# Altium schematic symbol library FPGA_Xilinx_Virtex5.SchLib: 41 symbols (part 26 of 27) (continued)
## XC5VTX150T-FF1759 (continued)
part V pins: AA21 VREFN_0 (io), AA22 VP_0 (io), AB21 VN_0 (io), AB22 VREFP_0 (io), AC21 DXN_0 (io), AC22 DXP_0 (io), AF15 TMS_0 (io), AF16 TCK_0 (io), AG16 TDI_0 (io), AG29 D_OUT_BUSY_0 (io), AH16 TDO_0 (io), AH28 M2_0 (io), AJ16 CCLK_0 (io), AJ27 M1_0 (io), AJ28 M0_0 (io), P13 VCCO_0 (power), P15 RDWR_B_0 (io), R14 DONE_0 (io), R15 D_IN_0 (io), R16 VCCO_0 (power), R29 PROGRAM_B_0 (io), T14 INIT_B_0 (io), T29 HSWAPEN_0 (io), T30 CS_B_0 (io)
part W pins: A6 GND (power), A7 GND (power), A12 GND (power), A13 GND (power), A18 GND (power), A19 GND (power), A23 GND (power), A24 GND (power), A25 GND (power), A30 GND (power), A31 GND (power), A36 GND (power), A37 GND (power), AA12 VCCAUX (power), AA14 VCCINT (power), AA16 VCCINT (power), AA18 VCCINT (power), AA20 VCCINT (power), AA24 VCCINT (power), AA26 VCCINT (power), AA28 VCCAUX (power), AB13 VCCINT (power), AB15 VCCINT (power), AB17 VCCINT (power), AB19 VCCINT (power), AB23 VCCINT (power), AB25 VCCINT (power), AB27 VCCINT (power), AB29 VCCAUX (power), AC12 VCCAUX (power), AC14 VCCINT (power), AC16 VCCINT (power), AC18 VCCINT (power), AC20 VCCINT (power), AC24 VCCINT (power), AC26 VCCINT (power), AC28 VCCINT (power), AD13 VCCAUX (power), AD15 VCCINT (power), AD17 VCCINT (power), AD19 VCCINT (power), AD21 VCCINT (power), AD23 VCCINT (power), AD25 VCCINT (power), AD27 VCCINT (power), AD29 VCCAUX (power), AE12 VCCAUX (power), AE14 VCCINT (power), AE16 VCCINT (power), AE18 VCCINT (power), AE20 VCCINT (power), AE22 VCCINT (power), AE24 VCCINT (power), AE26 VCCINT (power), AE28 VCCINT (power), AE30 VCCAUX (power), AF13 VCCAUX (power), AF17 VCCINT (power), AF19 VCCINT (power), AF21 VCCINT (power), AF23 VCCINT (power), AF25 VCCINT (power), AF27 VCCINT (power), AG18 VCCINT (power), AG20 VCCINT (power), AG22 VCCINT (power), AG24 VCCINT (power), AG26 VCCINT (power), AG28 VCCAUX (power), AG30 VCCAUX (power), AH19 VCCINT (power), AH21 VCCINT (power), AH23 VCCINT (power), AH25 VCCINT (power), AH27 VCCINT (power), AJ20 VCCINT (power), AJ22 VCCINT (power), AJ26 VCCINT (power), B3 GND (power), B4 GND (power), B9 GND (power), B10 GND (power), B15 GND (power), B16 GND (power), B19 GND (power), B20 GND (power), B24 GND (power), B27 GND (power), B28 GND (power), B33 GND (power), B34 GND (power), B39 GND (power), B40 GND (power), C6 GND (power), C12 GND (power), C18 GND (power), C19 GND (power), C24 GND (power), C25 GND (power), C31 GND (power), C37 GND (power), D1 GND (power), D3 GND (power), D5 GND (power), D6 GND (power), D7 GND (power), D8 GND (power), D9 GND (power), D11 GND (power), D12 GND (power), D13 GND (power), D14 GND (power), D15 GND (power), D17 GND (power), D18 GND (power), D19 GND (power), D24 GND (power), D25 GND (power), D26 GND (power), D28 GND (power), D29 GND (power), D30 GND (power), D31 GND (power), D32 GND (power), D34 GND (power), D35 GND (power), D36 GND (power), D37 GND (power), D38 GND (power), D40 GND (power), D42 GND (power), E4 GND (power), E5 GND (power), E6 GND (power), E9 GND (power), E10 GND (power), E11 GND (power), E15 GND (power), E16 GND (power), E17 GND (power), E21 GND (power), E26 GND (power), E27 GND (power), E28 GND (power), E31 GND (power), E32 GND (power), E33 GND (power), E34 GND (power), E38 GND (power), E39 GND (power), F2 GND (power), F5 GND (power), F8 GND (power), F18 GND (power), F28 GND (power), F33 GND (power), F38 GND (power), F41 GND (power), G2 GND (power), G4 GND (power), G5 GND (power), G15 GND (power), G25 GND (power), G35 GND (power), G38 GND (power), N20 VCCINT (power), P23 VCCINT (power), R18 VCCINT (power), R20 VCCINT (power), R22 VCCINT (power), R24 VCCINT (power), R28 VBATT_0 (power), T13 VCCAUX (power), T15 VCCINT (power), T17 VCCINT (power), T19 VCCINT (power), T21 VCCINT (power), T23 VCCINT (power), T25 VCCINT (power), T27 VCCINT (power), U14 VCCINT (power), U16 VCCINT (power), U18 VCCINT (power), U20 VCCINT (power), U22 VCCINT (power), U24 VCCINT (power), U26 VCCINT (power), U28 VCCAUX (power), V13 VCCAUX (power), V15 VCCINT (power), V17 VCCINT (power), V19 VCCINT (power), V21 VCCINT (power), V23 VCCINT (power), V25 VCCINT (power), V27 VCCINT (power), V29 VCCAUX (power), W12 VCCAUX (power), W14 VCCINT (power), W16 VCCINT (power), W18 VCCINT (power), W20 VCCINT (power), W22 VCCINT (power), W24 VCCINT (power), W26 VCCINT (power), W28 VCCAUX (power), Y13 VCCAUX (power), Y15 VCCINT (power), Y17 VCCINT (power), Y19 VCCINT (power), Y21 AVSS_0 (power), Y22 AVDD_0 (power), Y23 VCCINT (power), Y25 VCCINT (power), Y27 VCCINT (power)
part X pins: AA1 GND (power), AA5 GND (power), AA13 GND (power), AA15 GND (power), AA17 GND (power), AA19 GND (power), AA23 GND (power), AA25 GND (power), AA27 GND (power), AA29 GND (power), AA33 GND (power), AA38 GND (power), AA42 GND (power), AB1 GND (power), AB3 GND (power), AB5 GND (power), AB10 GND (power), AB12 GND (power), AB14 GND (power), AB16 GND (power), AB18 GND (power), AB20 GND (power), AB24 GND (power), AB26 GND (power), AB28 GND (power), AB30 GND (power), AB38 GND (power), AB40 GND (power), AB42 GND (power), AC4 GND (power), AC5 GND (power), AC7 GND (power), AC13 GND (power), AC15 GND (power), AC17 GND (power), AC19 GND (power), AC23 GND (power), AC25 GND (power), AC27 GND (power), AC29 GND (power), AC37 GND (power), AC38 GND (power), AC39 GND (power), AD2 GND (power), AD5 GND (power), AD12 GND (power), AD14 GND (power), AD16 GND (power), AD18 GND (power), AD20 GND (power), AD22 GND (power), AD24 GND (power), AD26 GND (power), AD28 GND (power), AD34 GND (power), AD38 GND (power), AD41 GND (power), AE2 GND (power), AE4 GND (power), AE5 GND (power), AE6 GND (power), AE11 GND (power), AE13 GND (power), AE15 GND (power), AE17 GND (power), AE19 GND (power), AE21 GND (power), AE23 GND (power), AE25 GND (power), AE27 GND (power), AE29 GND (power), AE31 GND (power), AE38 GND (power), AE39 GND (power), AE41 GND (power), AF4 GND (power), AF8 GND (power), AF18 GND (power), AF20 GND (power), AF22 GND (power), AF24 GND (power), AF26 GND (power), AF28 GND (power), AF30 GND (power), AF38 GND (power), AF39 GND (power), AG1 GND (power), AG4 GND (power), AG5 GND (power), AG15 GND (power), AG17 GND (power), AG19 GND (power), AG21 GND (power), AG23 GND (power), AG25 GND (power), AG27 GND (power), AG35 GND (power), AG39 GND (power), AG42 GND (power), AH1 GND (power), AH3 GND (power), AH4 GND (power), AH12 GND (power), AH18 GND (power), AH20 GND (power), AH22 GND (power), AH24 GND (power), AH26 GND (power), AH32 GND (power), AH39 GND (power), AH40 GND (power), AH42 GND (power), AJ4 GND (power), AJ5 GND (power), AJ9 GND (power), AJ19 GND (power), AJ21 GND (power), AJ23 GND (power), AJ29 GND (power), AJ38 GND (power), AJ39 GND (power), AK2 GND (power), AK5 GND (power), AK6 GND (power), AK16 GND (power), AK26 GND (power), AK36 GND (power), AK38 GND (power), AK41 GND (power), AL2 GND (power), AL4 GND (power), AL5 GND (power), AL13 GND (power), AL23 GND (power), AL33 GND (power), AL38 GND (power), AL39 GND (power), AL41 GND (power), AM4 GND (power), AM10 GND (power), AM20 GND (power), AM30 GND (power), AM39 GND (power), AN1 GND (power), AN4 GND (power), AN7 GND (power), AN17 GND (power), AN27 GND (power), AN37 GND (power), AN39 GND (power), AN42 GND (power), AP1 GND (power), AP3 GND (power), AP4 GND (power), AP14 GND (power), AP24 GND (power), AP34 GND (power), AP39 GND (power), AP40 GND (power), AP42 GND (power), G39 GND (power), G41 GND (power), H4 GND (power), H12 GND (power), H22 GND (power), H32 GND (power), H39 GND (power), J1 GND (power), J4 GND (power), J9 GND (power), J19 GND (power), J29 GND (power), J39 GND (power), J42 GND (power), K1 GND (power), K3 GND (power), K4 GND (power), K6 GND (power), K16 GND (power), K26 GND (power), K36 GND (power), K39 GND (power), K40 GND (power), K42 GND (power), L4 GND (power), L5 GND (power), L13 GND (power), L23 GND (power), L33 GND (power), L38 GND (power), L39 GND (power), M2 GND (power), M5 GND (power), M10 GND (power), M20 GND (power), M30 GND (power), M38 GND (power), M41 GND (power), N2 GND (power), N4 GND (power), N5 GND (power), N7 GND (power), N17 GND (power), N27 GND (power), N37 GND (power), N38 GND (power), N39 GND (power), N41 GND (power), P4 GND (power), P14 GND (power), P16 GND (power), P20 GND (power), P24 GND (power), P34 GND (power), P39 GND (power), R1 GND (power), R4 GND (power), R11 GND (power), R13 GND (power), R17 GND (power), R19 GND (power), R21 GND (power), R23 GND (power), R25 GND (power), R31 GND (power), R39 GND (power), R42 GND (power), T1 GND (power), T3 GND (power), T4 GND (power), T8 GND (power), T12 GND (power), T16 GND (power), T18 GND (power), T20 GND (power), T22 GND (power), T24 GND (power), T26 GND (power), T28 GND (power), T38 GND (power), T39 GND (power), T40 GND (power), T42 GND (power), U4 GND (power), U5 GND (power), U13 GND (power), U15 GND (power), U17 GND (power), U19 GND (power), U21 GND (power), U23 GND (power), U25 GND (power), U27 GND (power), U35 GND (power), U38 GND (power), U39 GND (power), V2 GND (power), V5 GND (power), V12 GND (power), V14 GND (power), V16 GND (power), V18 GND (power), V20 GND (power), V22 GND (power), V24 GND (power), V26 GND (power), V28 GND (power), V30 GND (power), V32 GND (power), V37 GND (power), V38 GND (power), V41 GND (power), W2 GND (power), W4 GND (power), W5 GND (power), W9 GND (power), W13 GND (power), W15 GND (power), W17 GND (power), W19 GND (power), W21 GND (power), W23 GND (power), W25 GND (power), W27 GND (power), W29 GND (power), W38 GND (power), W39 GND (power), W41 GND (power), Y4 GND (power), Y5 GND (power), Y6 GND (power), Y12 GND (power), Y14 GND (power), Y16 GND (power), Y18 GND (power), Y20 GND (power), Y24 GND (power), Y26 GND (power), Y28 GND (power), Y36 GND (power), Y38 GND (power), Y39 GND (power)
part Y pins: AR4 GND (power), AR5 GND (power), AR11 GND (power), AR21 GND (power), AR31 GND (power), AR38 GND (power), AR39 GND (power), AT2 GND (power), AT5 GND (power), AT8 GND (power), AT18 GND (power), AT28 GND (power), AT38 GND (power), AT41 GND (power), AU2 GND (power), AU4 GND (power), AU5 GND (power), AU10 GND (power), AU15 GND (power), AU25 GND (power), AU35 GND (power), AU38 GND (power), AU39 GND (power), AU41 GND (power), AV4 GND (power), AV5 GND (power), AV6 GND (power), AV8 GND (power), AV9 GND (power), AV10 GND (power), AV12 GND (power), AV14 GND (power), AV15 GND (power), AV16 GND (power), AV17 GND (power), AV22 GND (power), AV27 GND (power), AV28 GND (power), AV29 GND (power), AV32 GND (power), AV33 GND (power), AV34 GND (power), AV35 GND (power), AV37 GND (power), AV38 GND (power), AV39 GND (power), AW1 GND (power), AW6 GND (power), AW7 GND (power), AW8 GND (power), AW10 GND (power), AW11 GND (power), AW12 GND (power), AW13 GND (power), AW14 GND (power), AW16 GND (power), AW17 GND (power), AW18 GND (power), AW19 GND (power), AW24 GND (power), AW25 GND (power), AW26 GND (power), AW27 GND (power), AW29 GND (power), AW30 GND (power), AW31 GND (power), AW32 GND (power), AW33 GND (power), AW35 GND (power), AW36 GND (power), AW37 GND (power), AW42 GND (power), AY1 GND (power), AY3 GND (power), AY7 GND (power), AY13 GND (power), AY19 GND (power), AY24 GND (power), AY30 GND (power), AY36 GND (power), AY40 GND (power), AY42 GND (power), BA3 GND (power), BA4 GND (power), BA9 GND (power), BA10 GND (power), BA15 GND (power), BA16 GND (power), BA19 GND (power), BA23 GND (power), BA24 GND (power), BA27 GND (power), BA28 GND (power), BA33 GND (power), BA34 GND (power), BA39 GND (power), BA40 GND (power), BB6 GND (power), BB7 GND (power), BB12 GND (power), BB13 GND (power), BB18 GND (power), BB19 GND (power), BB20 GND (power), BB24 GND (power), BB25 GND (power), BB30 GND (power), BB31 GND (power), BB36 GND (power), BB37 GND (power)

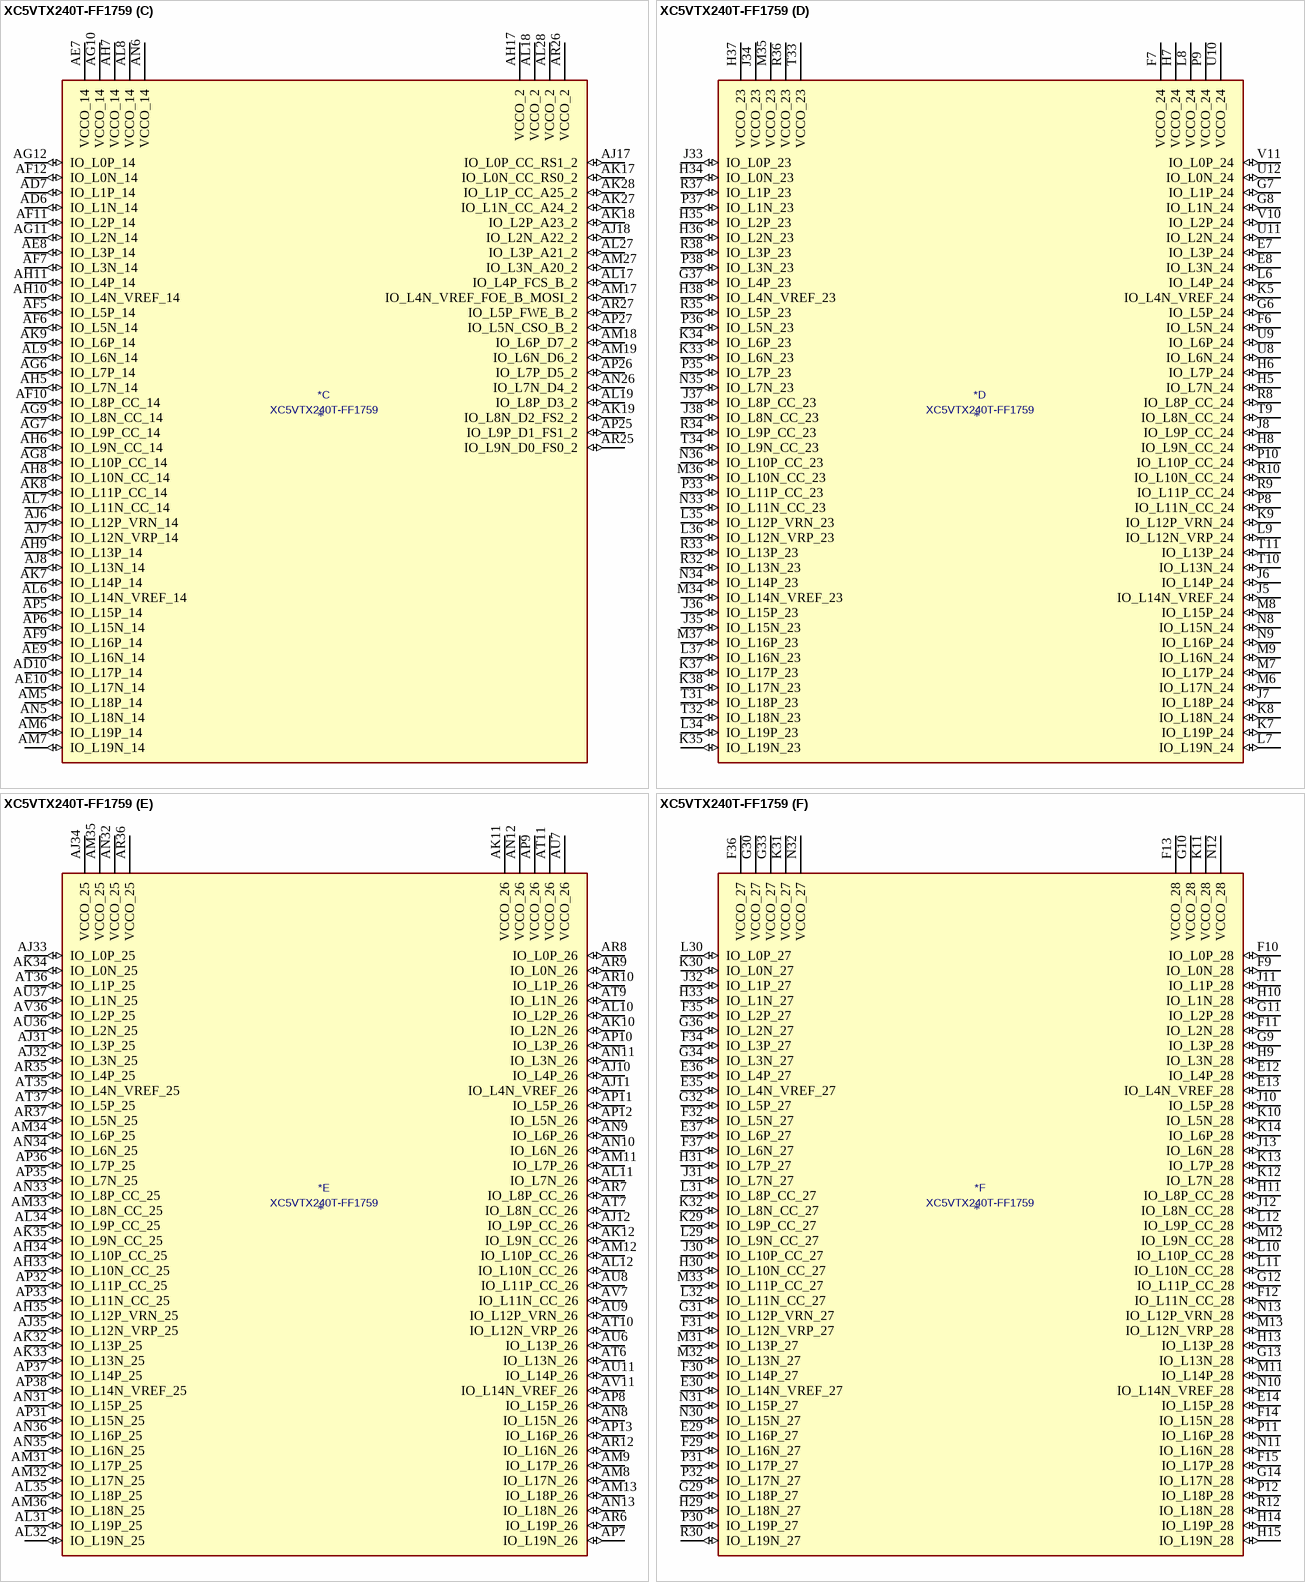
[diagram p134: symbol XC5VTX240T-FF1759]

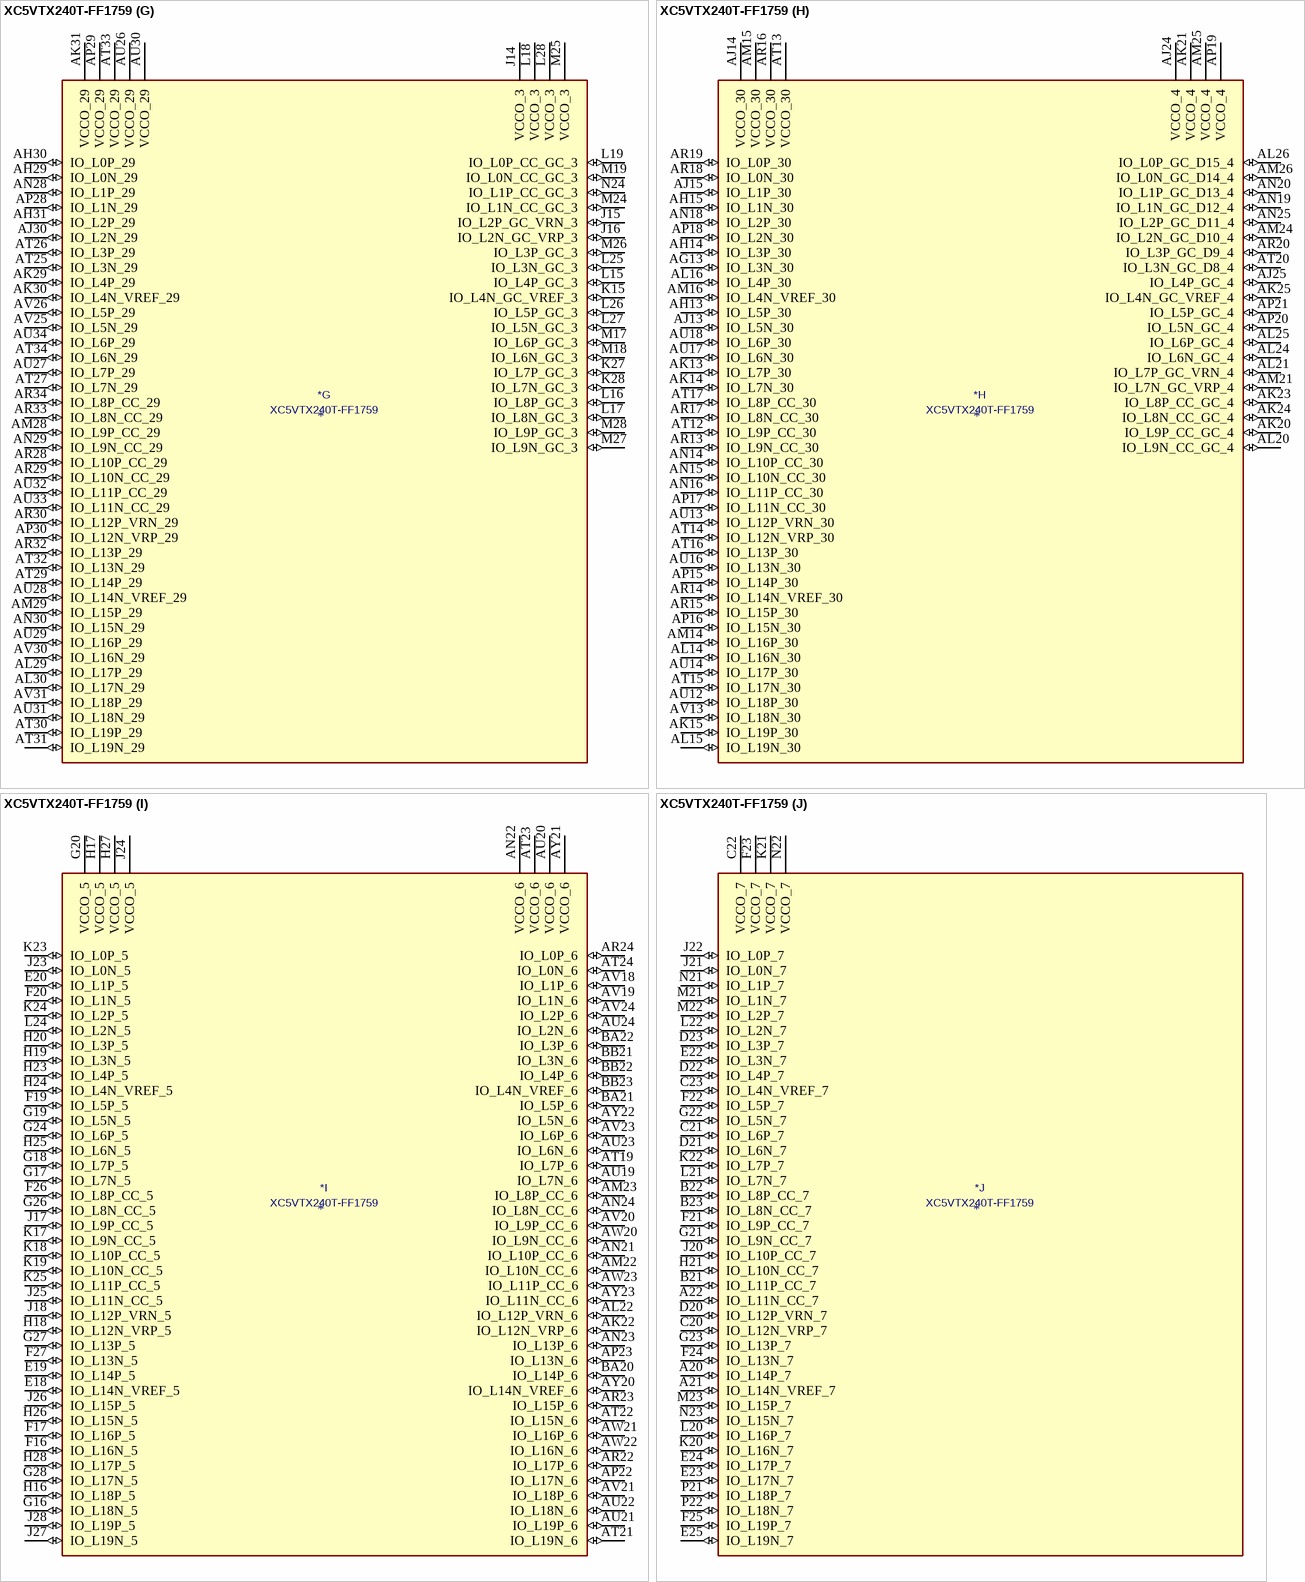
[diagram p135: symbol XC5VTX240T-FF1759]

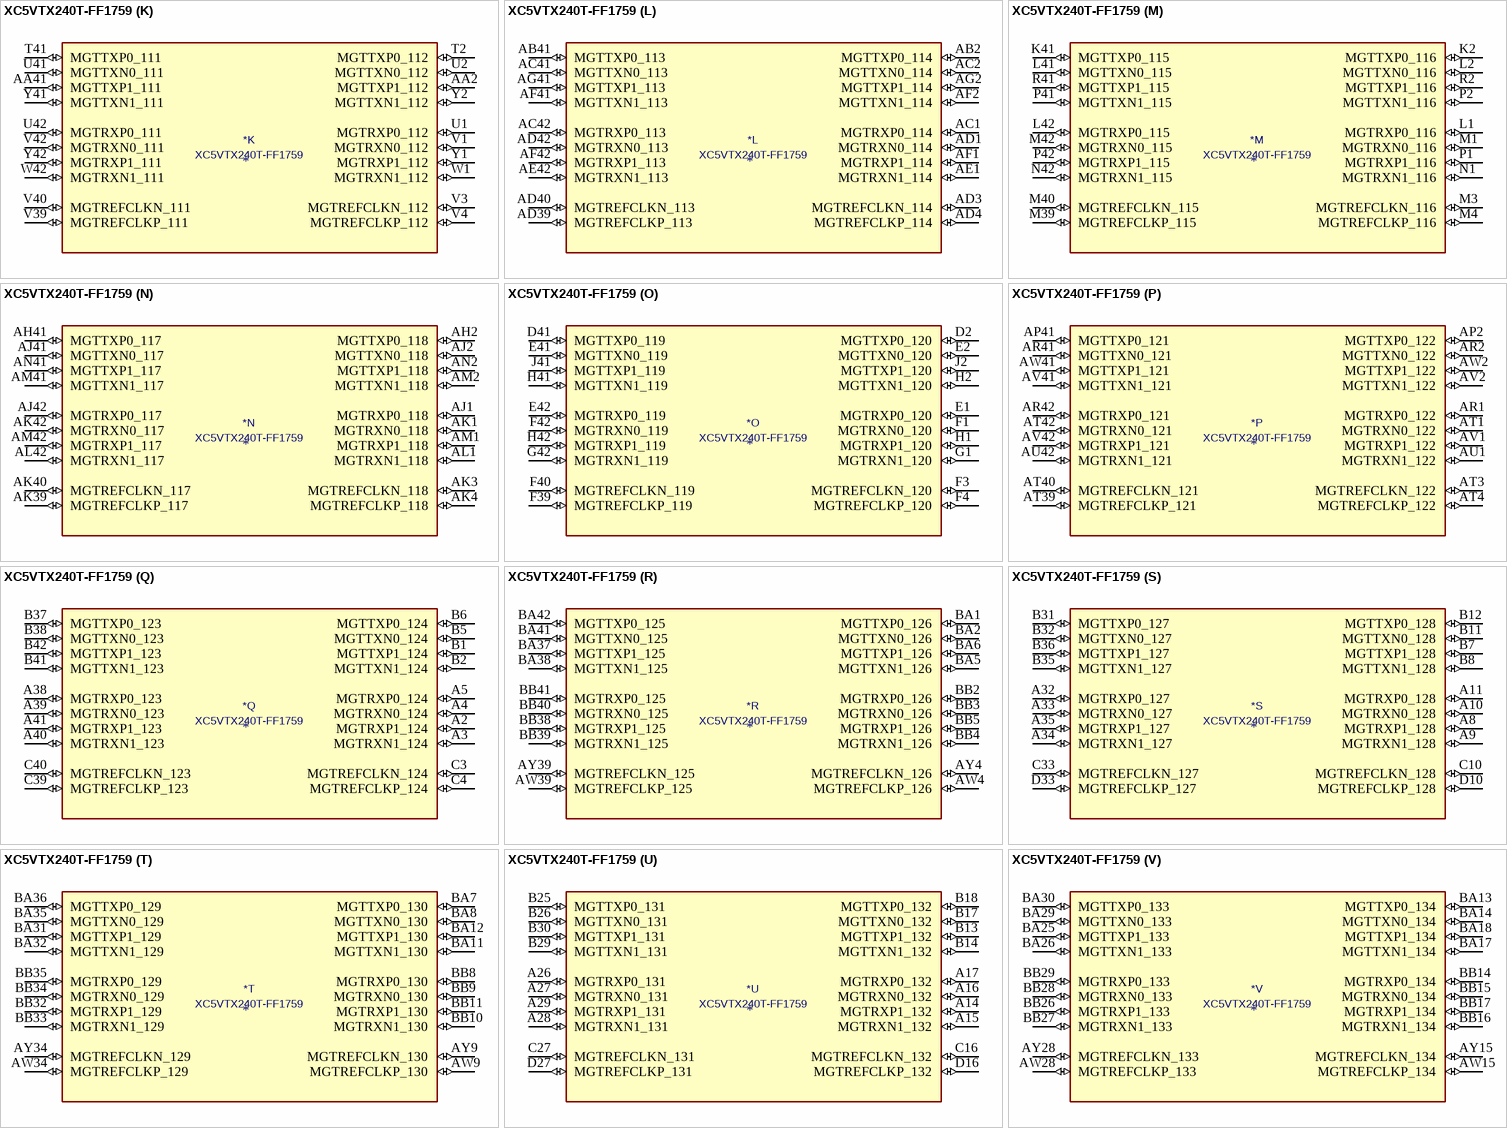
[diagram p136: symbol XC5VTX240T-FF1759]

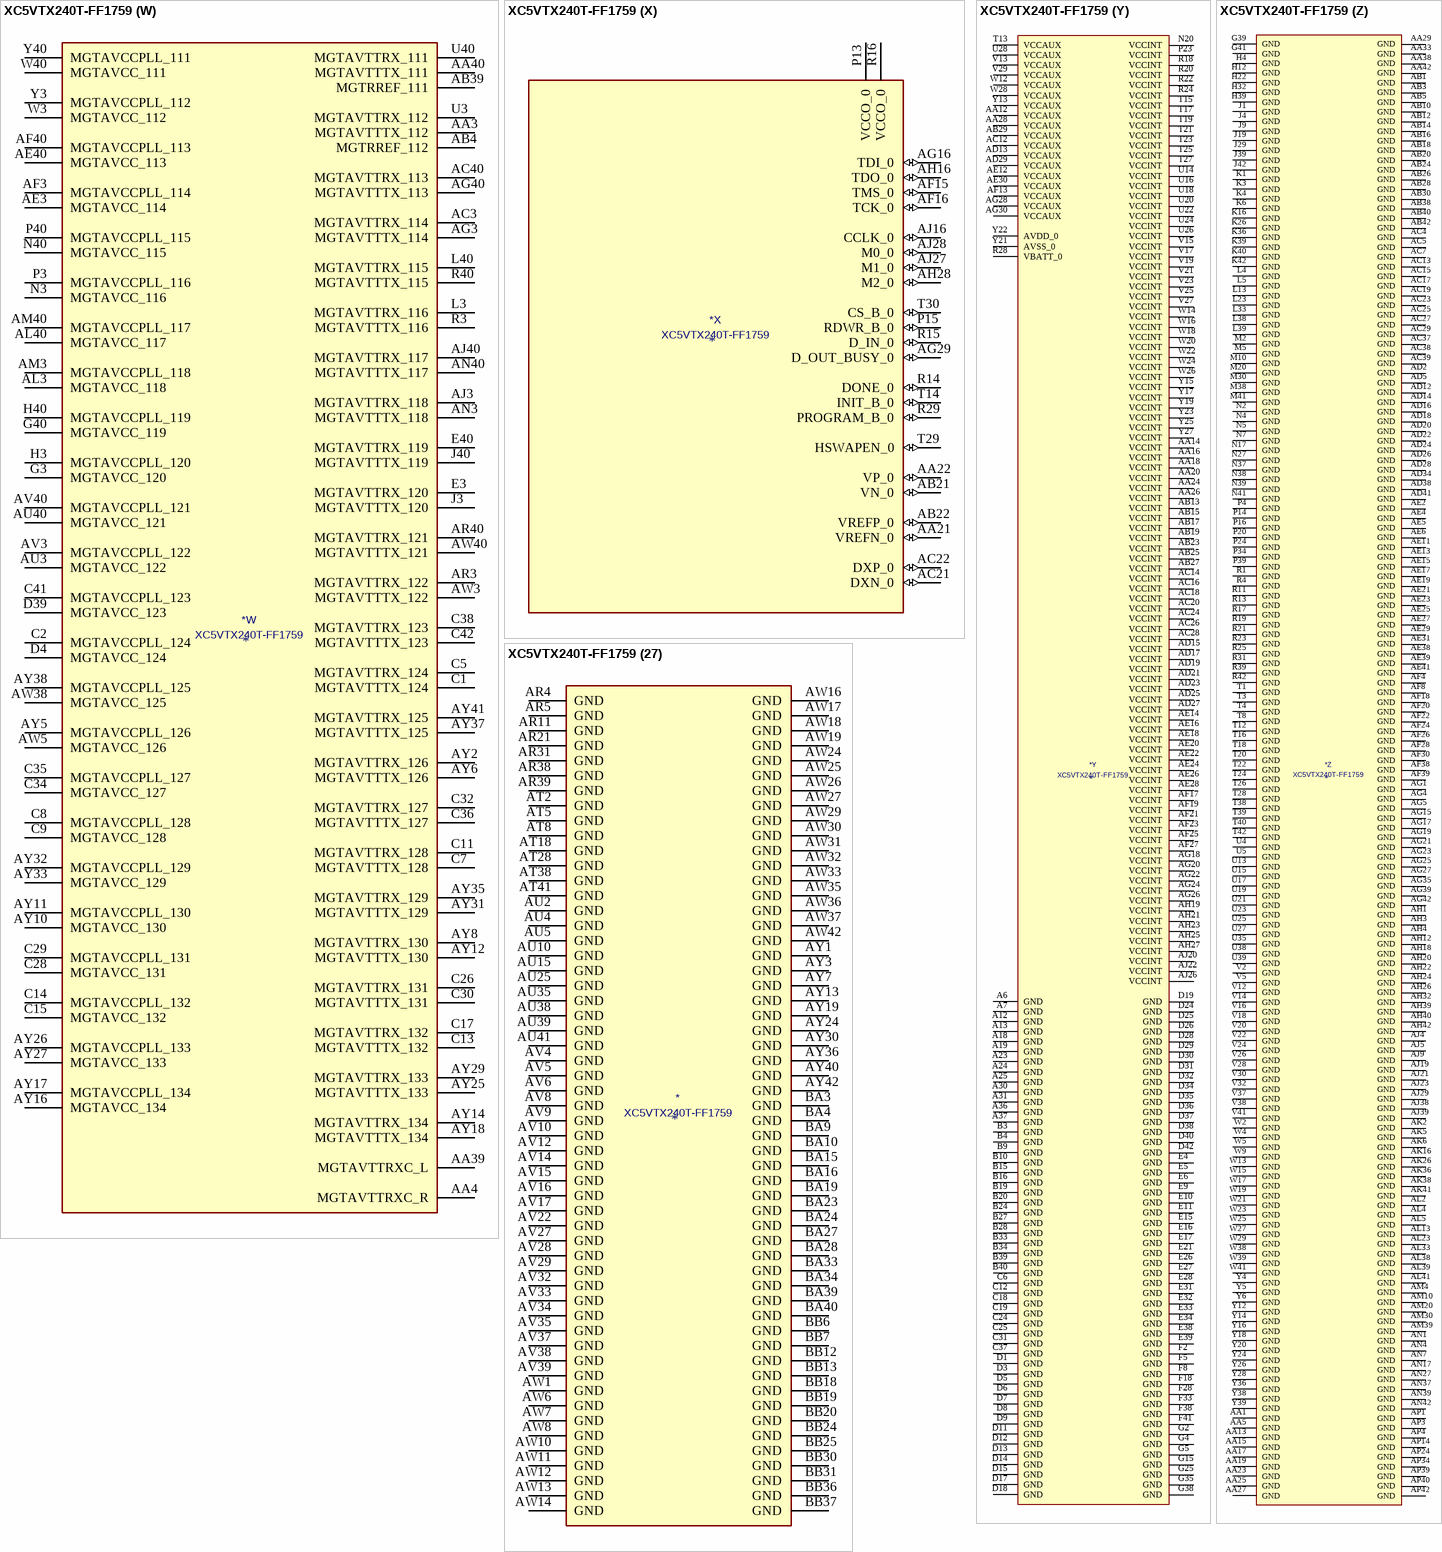
[diagram p137: symbol XC5VTX240T-FF1759]